# Altium footprint library Duong_update.PcbLib: 18 footprints (part 1 of 2)
Each footprint in its own frame and in the unit in brackets; x right, y up, seen from the top. Pads: shape width x height; smd on the part's side, far side on the other; paste and mask are expansions set on the pad; w line width, h text height; cw(c..) or ccw(c..) is an arc to the next point about the centre after c.
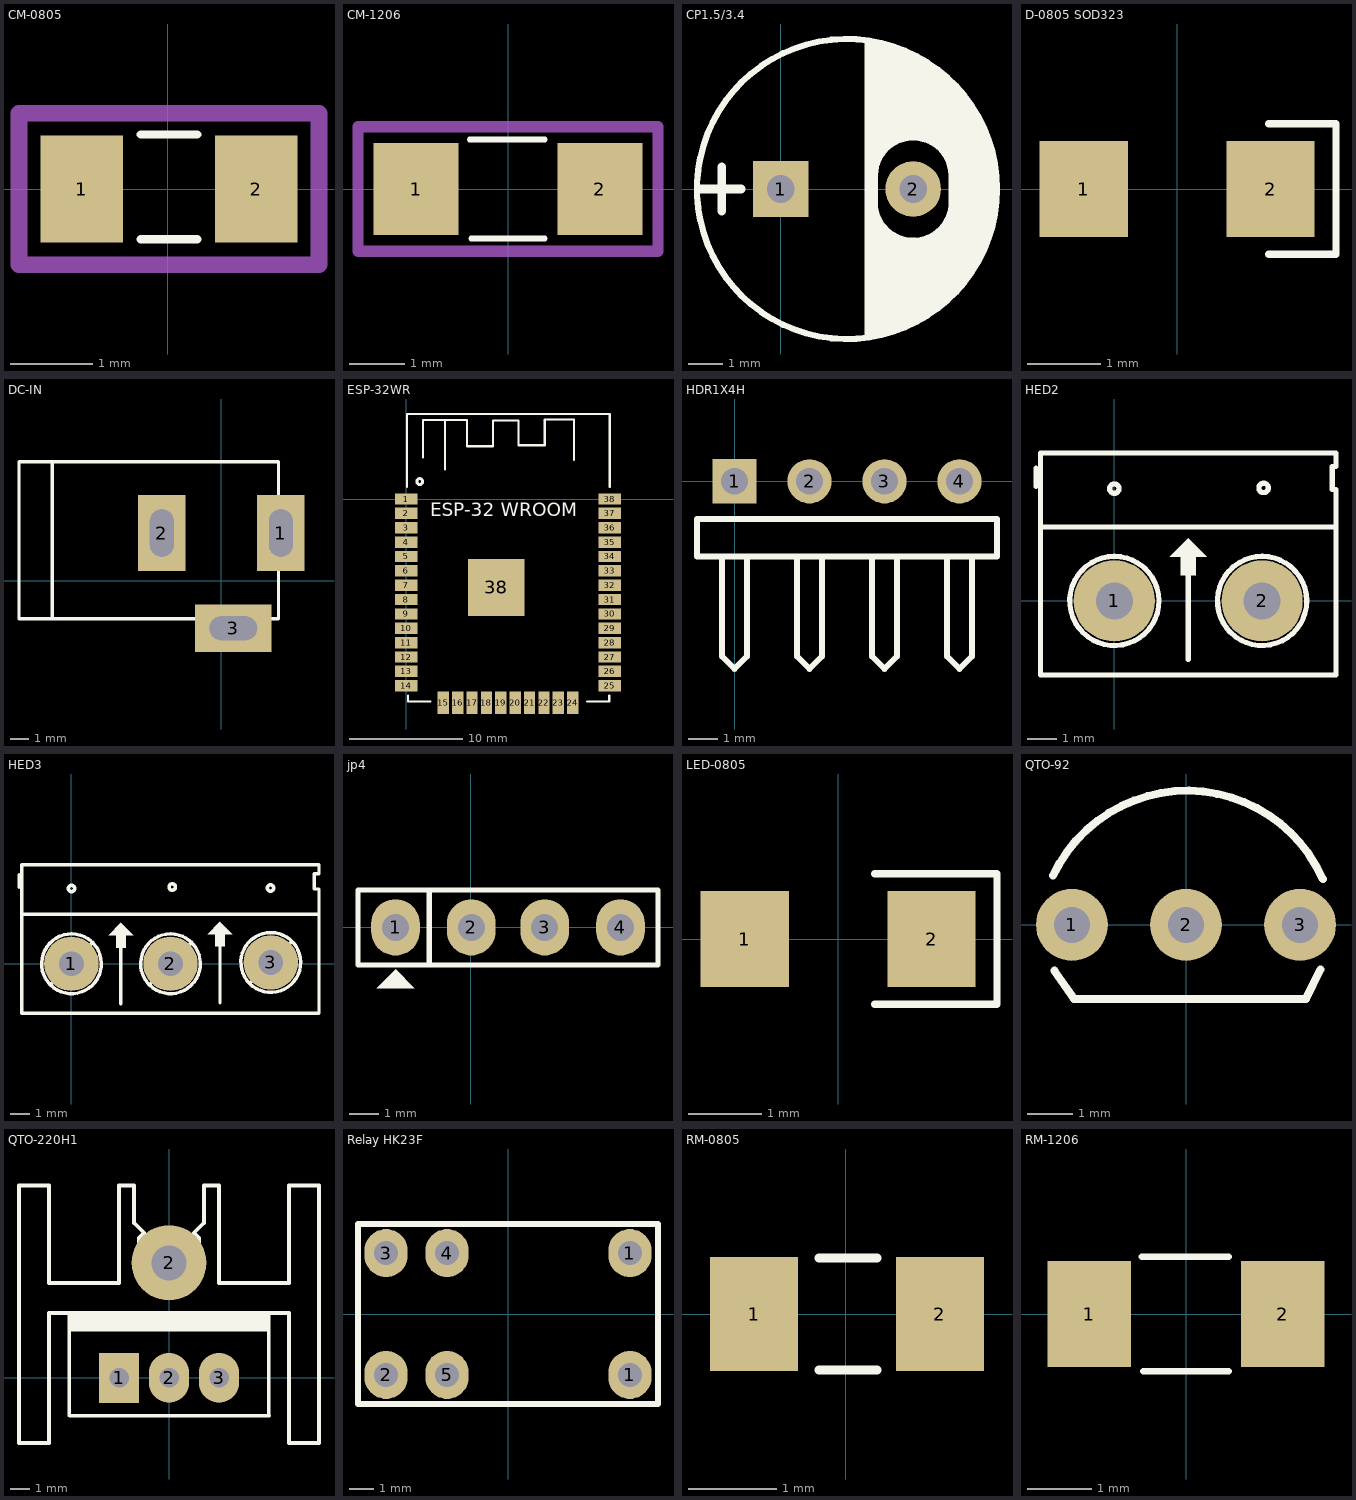
[diagram p0: the footprints below, top view; thin cyan lines are the x and y axes]

## CM-0805 [mm] "Capacitor SMD 80x50mil"
height 1.27
pads (2):
  rect 1x1.3 smd: 1(-1.041,0) 2(1.067,0)
Top Overlay:
  lines w0.102: -0.33,-0.61 0.356,-0.61 ; -0.33,0.66 0.356,0.66
Mechanical 15:
  lines w0.2: -1.803,-0.914 -1.803,0.914 1.829,0.914 1.829,-0.914 -1.803,-0.914
3D body "SW3dPS-smt_resistor_packages.STEP": height 0.61, standoff -0.01, extent -1.01,-0.61 1.01,0.66

## CM-1206 [mil] "Capacitor SMD 120x60mil"
height 50
pads (2):
  rect 60x65 smd: 1(-65,0) 2(65,0)
Top Overlay:
  lines w4: -27,35 26,35 ; -26,-35 26,-35
Mechanical 15:
  lines w7.87: -106,-44 106,-44 106,44 -106,44 -106,-44
3D body "User Library-res1206.STEP": height 24.79, standoff 0, extent -82.68,-35 82.68,35.87

## CP1.5/3.4 [mm] "Tu hoa 220->470uF,16V, 470uF/16V,25V"
height 7.62
pads (2):
  rect 1.6x1.6 hole 0.8: 1(0,0)
  round 1.6 hole 0.8: 2(3.81,0)
Top Overlay:
  circle w0.178: c1.905,0 r4.318
  region: 2.54,0.635 3.429,1.524 4.138,1.524 4.181,1.522 4.264,1.505 4.343,1.473 4.413,1.426 4.445,1.397 4.609,1.233 4.629,1.211 4.663,1.161 4.686,1.105 4.698,1.046 4.699,1.016 4.826,0.889 4.855,0.857 4.902,0.787 4.934,0.708 4.951,0.625 4.953,0.582 4.953,-0.709 4.951,-0.752 4.934,-0.835 4.902,-0.914 4.855,-0.984 4.826,-1.016 4.535,-1.307 4.513,-1.327 4.463,-1.361 4.407,-1.384 4.348,-1.396 4.318,-1.397 4.286,-1.426 4.216,-1.473 4.137,-1.505 4.054,-1.522 4.011,-1.524 3.661,-1.524 3.576,-1.52 3.409,-1.487 3.252,-1.422 3.111,-1.327 3.048,-1.27 2.757,-0.979 2.737,-0.957 2.703,-0.907 2.68,-0.851 2.668,-0.792 2.667,-0.762 2.54,-0.762 2.54,-4.318 3.937,-3.81 4.953,-3.048 5.715,-2.032 6.223,-0.508 6.223,0.508 5.842,1.778 5.08,2.921 4.191,3.683 3.048,4.191 2.54,4.318
  lines w0.254: -2.286,0 -1.143,0 ; -1.702,-0.635 -1.702,0.635 ; 2.54,-4.191 2.54,4.191 ; 2.54,0.635 2.667,0.635 ; 2.667,-0.508 2.667,0.762 ; 2.667,-0.254 ccw(c3.81,-0.381) 3.683,-1.524 ccw(c3.81,-0.381) 4.953,-0.508 4.953,0.381 ccw(c3.81,0.381) 3.81,1.524 ccw(c3.81,0.381) 2.667,0.381
3D body "User Library-CAP 8X11_5.STEP": height 11.33, standoff -19.16, extent -2.158,-4 5.842,4

## D-0805 SOD323 [mm] "Resistor SMD 80x50mil"
height 1.27
pads (2):
  rect 1.2x1.3 smd: 1(-1.27,0) 2(1.27,0)
Top Overlay:
  lines w0.102: 1.245,-0.889 2.159,-0.889 2.159,0.889 1.245,0.889
3D body "SW3dPS-SOD-323.STEP": height 1.1, standoff 0, extent -1.325,-0.675 1.275,0.675

## DC-IN [mil] "Jac DC input"
height 200
pads (3):
  rect 100x160 hole 50 slot 100 at 90 deg: 1(125,100) 2(-125,100)
  rect 160x100 hole 50 slot 100 at 0 deg: 3(25,-100)
Top Overlay:
  lines w7: -355,-80 -355,250 ; -425,-80 -425,250 120,250 120,-80 -425,-80
3D body "User Library-DC_JACK_10A.step": height 433.07, standoff -137.8, extent -418.12,-112.98 137,264.98

## ESP-32WR [mm] "Footprint for ESP-32WROOM"
pads (39):
  rect 2x1 smd: 1(0,0) 2(0,-1.27) 3(0,-2.54) 4(0,-3.81) 5(0,-5.08) 6(0,-6.35) 7(0,-7.62) 8(0,-8.89) 9(0,-10.16) 10(0,-11.43) 11(0,-12.7) 12(0,-13.97) 13(0,-15.24) 14(0,-16.51) 25(18,-16.51) 26(18,-15.24) 27(18,-13.97) 28(18,-12.7) 29(18,-11.43) 30(18,-10.16) 31(18,-8.89) 32(18,-7.62) 33(18,-6.35) 34(18,-5.08) 35(18,-3.81) 36(18,-2.54) 37(18,-1.27) 38(18,0)
  rect 1x2 smd: 15(3.285,-18.01) 16(4.555,-18.01) 17(5.825,-18.01) 18(7.095,-18.01) 19(8.365,-18.01) 20(9.635,-18.01) 21(10.905,-18.01) 22(12.175,-18.01) 23(13.445,-18.01) 24(14.715,-18.01)
  rect 5x5 smd: 38(7.976,-7.823)
Top Overlay:
  lines w0.2: 0.076,1.086 0.076,7.518 18.009,7.518 18.009,1.086 ; 0.152,-17.399 0.152,-17.907 2.134,-17.907 ; 1.473,3.677 1.473,6.979 5.385,6.979 5.385,4.668 7.671,4.668 7.671,6.954 9.931,6.954 9.931,4.744 12.243,4.744 12.243,7.03 14.834,7.03 14.834,3.474 ; 3.429,2.61 3.429,6.979 ; 15.977,-17.907 17.958,-17.907 17.958,-17.399
  lines w0.254: 1.455,1.561 ccw(c1.194,1.543) 1.455,1.543
  text "ESP-32 WROOM" at 2.113,-1.92 h2.03
3D body "User Library-ESP321.STEP": height 2.91, standoff -0.01, extent 0.042,-17.983 18.042,7.517

## HDR1X4H [mm] "Connector; Header; 4 Position; Right Angle"
pads (4):
  rect 1.5x1.5 hole 0.9: 1(0,0)
  round 1.5 hole 0.9: 2(2.54,0) 3(5.08,0) 4(7.62,0)
Top Overlay:
  lines w0.2: -0.423,-2.54 -0.423,-5.927 0,-6.35 0.423,-5.927 0.423,-2.54 ; 2.117,-2.54 2.117,-5.927 2.54,-6.35 2.963,-5.927 2.963,-2.54 ; 4.657,-2.54 4.657,-5.927 5.08,-6.35 5.503,-5.927 5.503,-2.54 ; 7.197,-2.54 7.197,-5.927 7.62,-6.35 8.043,-5.927 8.043,-2.54 ; -1.27,-2.54 8.89,-2.54 8.89,-1.27 -1.27,-1.27 -1.27,-2.54

## HED2 [mil] "Header 2, 2 pin, hight 300mil, Pin to Pin 200, Colour Green"
height 300
pads (2):
  round 110 hole 50: 1(0,0) 2(200,0)
Top Overlay:
  circle w7: c202,153 r6.4
  circle w7: c0,152 r6.4
  region: 100,85 75,60 90,60 90,35 110,35 110,60 125,60
  lines w7: -106,155 -106,180 ; -98,100 299,100 ; 38.83,46.23 ccw(c0,0) 40.11,45.12 ; 100,-79 100,72 ; 238.74,46.3 ccw(c200,0) 240.11,45.12 ; -100,-100 -100,50 -100,200 300,200 300,182 295,182 295,151 300,151 300,-100 -100,-100
3D body "SW3dPS-KRM2.STEP": height 393.7, standoff -157.48, extent -91.85,-90 301.85,205.28

## HED3 [mil] "Header 3, 3 pin, hight 300mil, Pin to Pin 200, Colour Green"
height 300
pads (3):
  round 110 hole 50: 1(0,0) 2(200,0) 3(402.62,2.62)
Top Overlay:
  circle w7: c203.6,155 r6.4
  circle w7: c0,152 r6.4
  circle w7: c402,153 r6.4
  region: 100,82.5 75,57.5 90,57.5 90,32.5 110,32.5 110,57.5 125,57.5
  region: 300,85 275,60 290,60 290,35 310,35 310,60 325,60
  lines w7: -106,155 -106,180 ; -100,100 500,100 ; -42,-42 43,43 ; 39.44,45.71 ccw(c0,0) 44.97,40.28 ; 100,-81 100,70 ; 158.5,-41.5 243,43 ; 238.89,46.18 ccw(c200,0) 245.38,39.82 ; 300,-79 300,72 ; 360,-39 445,45 ; 441.65,48.68 ccw(c402.62,2.62) 448.22,42.19 ; -100,-100 -100,50 -100,200 500,200 500,182 490,182 490,151 500,151 500,-100 -100,-100

## jp4 [mil] "Jumper 4"
height 200
pads (4):
  oval 65x75 hole 36: 1(-100,0) 2(1,0) 3(99,0) 4(200,0)
Top Overlay:
  region: -100,-56 -125,-81 -75,-81
  lines w7: -55,-50 -55,49 ; -150,-50 -150,50 250,50 250,-50 -150,-50
3D body "Header 4 2-54.step": height 320, standoff -107, extent -141,-45 243,47

## LED-0805 [mm] "Resistor SMD 80x50mil"
height 1.27
pads (2):
  rect 1.2x1.3 smd: 1(-1.27,0) 2(1.27,0)
Top Overlay:
  lines w0.102: 0.5,-0.889 2.159,-0.889 2.159,0.889 0.5,0.889
3D body "User Library-Resistor-4.STEP": height 0.58, standoff -0.03, extent -0.965,-0.635 1.035,0.615

## QTO-92 [mm] "TO-92"
height 5.08
pads (3):
  round 1.6 hole 0.8: 1(-2.54,0) 2(0,0) 3(2.54,0)
Top Overlay:
  lines w0.178: -2.96,1.098 cw(c0.025,-0.316) 3.046,1.015 ; -2.93,-1.022 -2.489,-1.651 2.667,-1.651 2.997,-0.991
3D body "SW3dPS-TO92.STEP": height 9.78, standoff -1.52, extent -2.765,-1.665 2.765,2.413

## QTO-220H1 [mil] "TO-220 - 1-2-3"
height 200
pads (4):
  rect 80x100 hole 39: 1(-100,0)
  oval 80x100 hole 39: 2(0,0) 3(100,0)
  round 150 hole 70: 2(0,230)
Top Overlay:
  rectangle: -201,92.99 198,128.99
  lines w7: -200,100 198.5,100 199,93 ; -200,-75 -199,-76 -176,-76 200,-76 199,-75 199,130 -200,130 -200,-75
  lines w8: -300,-130 -300,385 -240,385 -240,190 -100,190 -100,385 -70,385 -70,310 -50,290 -60,280 -60,210 -40,190 40,190 60,210 60,280 50,290 70,310 70,385 100,385 100,190 240,190 240,385 300,385 300,-130 240,-130 240,130 -240,130 -240,-130 -300,-130
3D body "User Library-Disipador 34M8491-1.STEP": height 1000, standoff -122.05, extent -246,73.03 250.06,328.97
3D body "User Library-TO-220-1.STEP": height 850.24, standoff -282.83, extent -194.88,-82 194.88,95.17

## Relay HK23F [mm] "HK23F W12.5x7.5x10.3mm"
pads (6):
  oval 1.8x2 hole 1: 1(5.08,-2.54) 1(5.08,2.54) 2(-5.08,-2.54) 3(-5.08,2.54) 4(-2.54,2.54) 5(-2.54,-2.54)
Top Overlay:
  lines w0.254: -6.25,-3.75 6.25,-3.75 6.25,3.75 -6.25,3.75 -6.25,-3.75
3D body "User Library-HK23F.STEP": height 10.01, standoff -3, extent -6.224,-3.775 6.276,3.725

## RM-0805 [mm] "Resistor SMD 80x50mil"
height 1.27
pads (2):
  rect 1x1.3 smd: 1(-1.041,0) 2(1.067,0)
Top Overlay:
  lines w0.102: -0.305,-0.635 0.356,-0.635 ; -0.305,0.635 0.356,0.635
3D body "User Library-Resistor-4.STEP": height 0.58, standoff -0.03, extent -0.965,-0.635 1.035,0.615

## RM-1206 [mm] "Resistor SMD 120x60mil"
height 1.27
pads (2):
  rect 1.3x1.651 smd: 1(-1.5,0) 2(1.5,0)
Top Overlay:
  lines w0.102: -0.686,0.889 0.66,0.889 ; -0.66,-0.889 0.66,-0.889
3D body "User Library-res1206.STEP": height 0.63, standoff 0, extent -2.1,-0.889 2.1,0.911